# Altium footprint library TarabusLib_KAP.PcbLib: 504 footprints (part 8 of 32)
Each footprint in its own frame and in the unit in brackets; x right, y up, seen from the top. Pads: shape width x height; smd on the part's side, far side on the other; paste and mask are expansions set on the pad; w line width, h text height; cw(c..) or ccw(c..) is an arc to the next point about the centre after c.
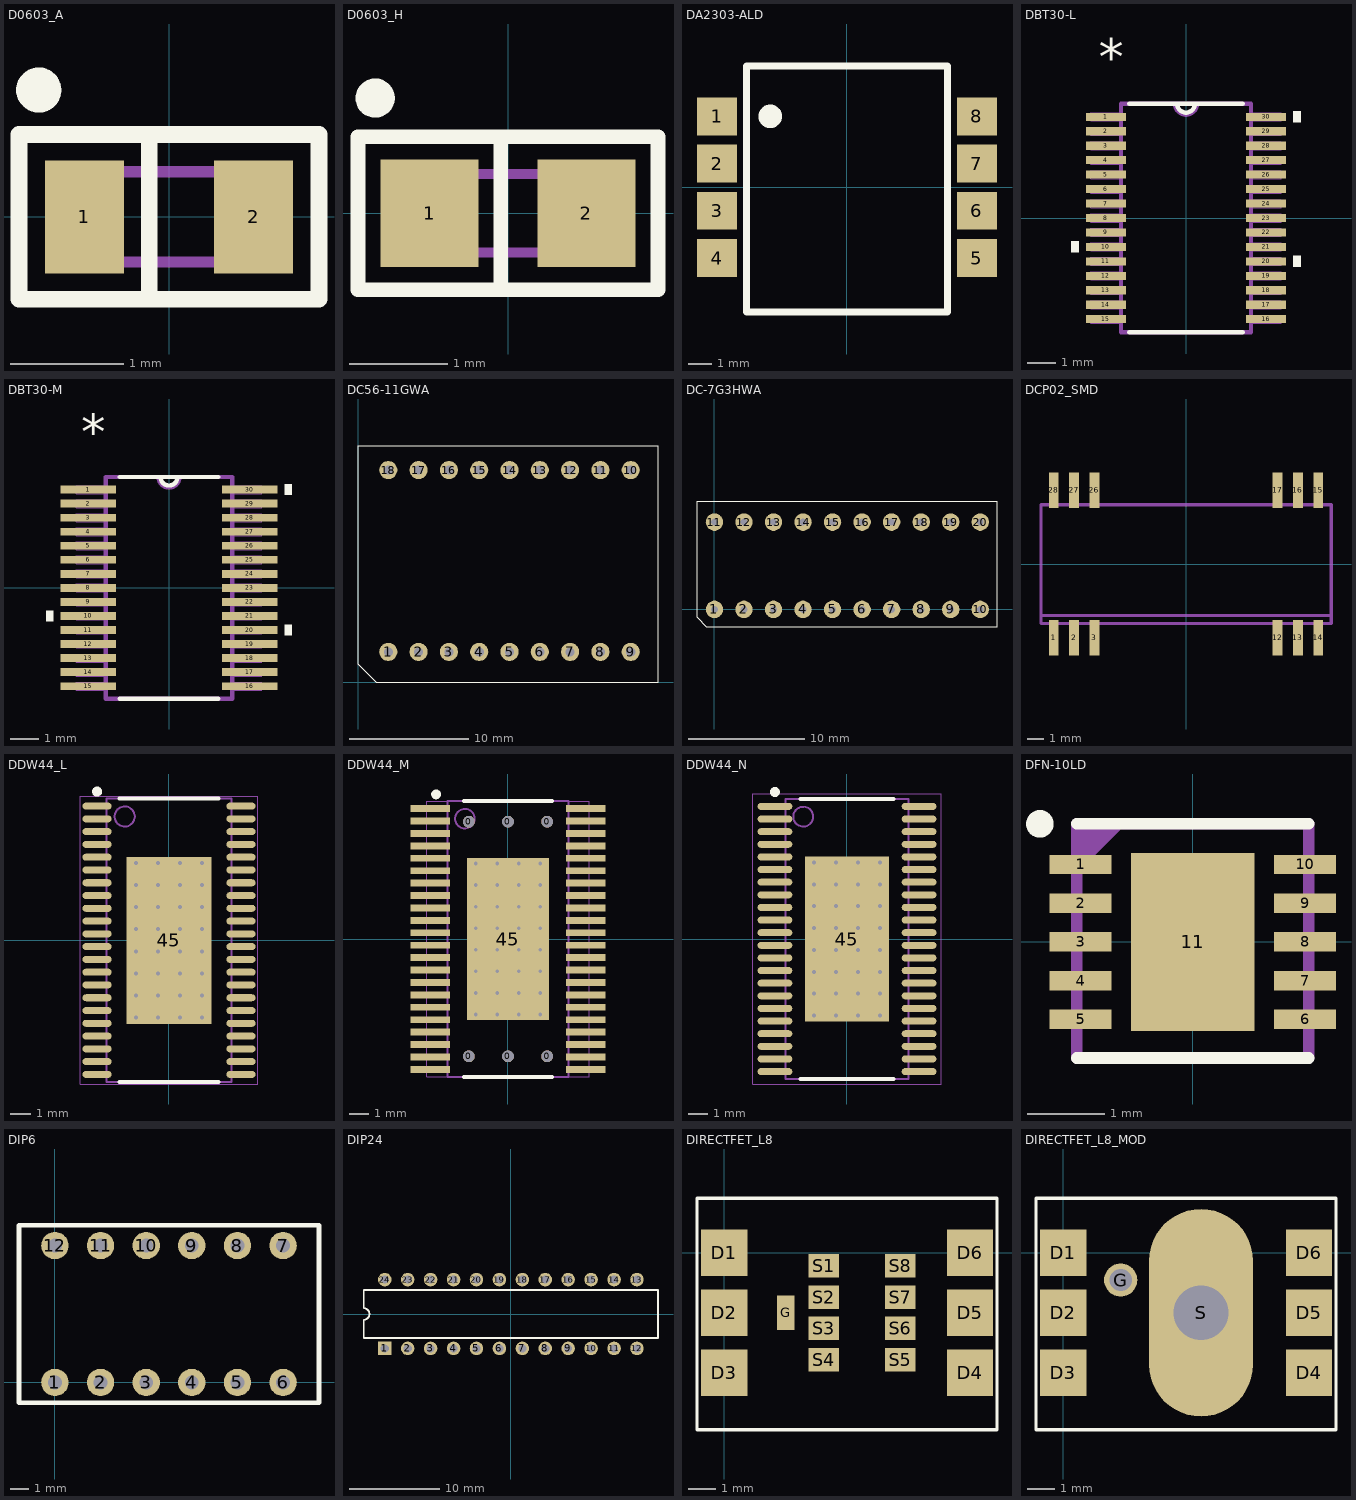
[diagram p7: the footprints below, top view; thin cyan lines are the x and y axes]

## D0603_A [mm]
height 1.1
pads (2):
  rect 0.7x1 smd: 1(-0.75,0) 2(0.75,0)
Top Overlay:
  circle w0.2: c-1.155,1.125 r0.1
  lines w0.15: -0.175,-0.73 -0.175,0.73 ; -1.33,-0.73 -1.33,0.73 1.33,0.73 1.33,-0.73 -1.33,-0.73
Mechanical 7:
  lines w0.1: -0.7,-0.4 -0.7,0.4 ; -0.6,-0.4 -0.6,0.4 ; -0.5,-0.4 -0.5,0.4 ; -0.8,-0.4 0.8,-0.4 0.8,0.4 -0.8,0.4 -0.8,-0.4
Mechanical 10:
  text ".Comment" at -0.75,-1.28 h0.6
  text ".Designator" at -0.62,1 h0.8
3D body: height 1.1, standoff 0, extent -0.8,-0.4 0.8,0.4

## D0603_H [mm]
height 1.1
pads (2):
  rect 1x1.1 smd: 1(-0.8,0) 2(0.8,0)
Top Overlay:
  circle w0.2: c-1.355,1.175 r0.1
  lines w0.15: -0.075,-0.78 -0.075,0.78 ; -1.53,-0.78 -1.53,0.78 1.53,0.78 1.53,-0.78 -1.53,-0.78
Mechanical 7:
  lines w0.1: -0.7,-0.4 -0.7,0.4 ; -0.6,-0.4 -0.6,0.4 ; -0.5,-0.4 -0.5,0.4 ; -0.8,-0.4 0.8,-0.4 0.8,0.4 -0.8,0.4 -0.8,-0.4
Mechanical 10:
  text ".Designator" at -0.62,1 h0.8
  text ".Comment" at -0.61,-1.33 h0.6
3D body: height 1.1, standoff 0, extent -0.8,-0.4 0.8,0.4

## DA2303-ALD [mm]
pads (8):
  rect 1.7x1.6 smd: 1(-5.5,3) 2(-5.5,1) 3(-5.5,-1) 4(-5.5,-3) 5(5.5,-3) 6(5.5,-1) 7(5.5,1) 8(5.5,3)
Top Overlay:
  circle w0.5: c-3.25,3 r0.25
  lines w0.3: -4.25,-5.275 -4.25,5.125 4.25,5.125 4.25,-5.125 4.25,-5.275 -4.25,-5.275
3D body "coil-da2303.STEP": height 5.95, standoff -0.02, extent -6.023,-5.075 6.047,4.925

## DBT30-L [mil]
height 47
pads (30):
  rect 54x11 smd: 1(-109,137.8) 2(-109,118.11) 3(-109,98.43) 4(-109,78.74) 5(-109,59.06) 6(-109,39.37) 7(-109,19.68) 8(-109,0) 9(-109,-19.69) 10(-109,-39.37) 11(-109,-59.06) 12(-109,-78.74) 13(-109,-98.43) 14(-109,-118.11) 15(-109,-137.8) 16(109,-137.8) 17(109,-118.11) 18(109,-98.43) 19(109,-78.74) 20(109,-59.06) 21(109,-39.37) 22(109,-19.68) 23(109,0) 24(109,19.69) 25(109,39.37) 26(109,59.06) 27(109,78.74) 28(109,98.43) 29(109,118.11) 30(109,137.8)
Top Overlay:
  region: 146,145.3 156,145.3 156,130.3 146,130.3
  region: 146,-51.56 156,-51.56 156,-66.56 146,-66.56
  region: -146,-31.87 -156,-31.87 -156,-46.87 -146,-46.87
  lines w6: -77.24,-155.5 77.24,-155.5 ; -77.24,155.5 77.24,155.5 ; -12,155.5 ccw(c0,155.5) 12,155.5
  text "*" at -119,193.8 h50
Mechanical 1:
  lines w0: -12,155.5 ccw(c0,155.5) 12,155.5 ; -130,-143.3 -88.5,-143.3 -88.5,-132.3 -130,-132.3 -130,-143.3 ; -130,-123.61 -88.5,-123.61 -88.5,-112.61 -130,-112.61 -130,-123.61 ; -130,-103.93 -88.5,-103.93 -88.5,-92.93 -130,-92.93 -130,-103.93 ; -130,-84.24 -88.5,-84.24 -88.5,-73.24 -130,-73.24 -130,-84.24 ; -130,-64.56 -88.5,-64.56 -88.5,-53.56 -130,-53.56 -130,-64.56 ; -130,-44.87 -88.5,-44.87 -88.5,-33.87 -130,-33.87 -130,-44.87 ; -130,-25.19 -88.5,-25.19 -88.5,-14.19 -130,-14.19 -130,-25.19 ; -130,-5.5 -88.5,-5.5 -88.5,5.5 -130,5.5 -130,-5.5 ; -130,14.19 -88.5,14.19 -88.5,25.18 -130,25.18 -130,14.19 ; -130,33.87 -88.5,33.87 -88.5,44.87 -130,44.87 -130,33.87 ; -130,53.56 -88.5,53.56 -88.5,64.56 -130,64.56 -130,53.56 ; -130,73.24 -88.5,73.24 -88.5,84.24 -130,84.24 -130,73.24 ; -130,92.93 -88.5,92.93 -88.5,103.93 -130,103.93 -130,92.93 ; -130,112.61 -88.5,112.61 -88.5,123.61 -130,123.61 -130,112.61 ; -130,132.3 -88.5,132.3 -88.5,143.3 -130,143.3 -130,132.3 ; -88.5,-155.5 -88.5,155.5 88.5,155.5 88.5,-155.5 -88.5,-155.5 ; 88.5,-143.3 130,-143.3 130,-132.3 88.5,-132.3 88.5,-143.3 ; 88.5,-123.61 130,-123.61 130,-112.61 88.5,-112.61 88.5,-123.61 ; 88.5,-103.93 130,-103.93 130,-92.93 88.5,-92.93 88.5,-103.93 ; 88.5,-84.24 130,-84.24 130,-73.24 88.5,-73.24 88.5,-84.24 ; 88.5,-64.56 130,-64.56 130,-53.56 88.5,-53.56 88.5,-64.56 ; 88.5,-44.87 130,-44.87 130,-33.87 88.5,-33.87 88.5,-44.87 ; 88.5,-25.18 130,-25.18 130,-14.19 88.5,-14.19 88.5,-25.18 ; 88.5,-5.5 130,-5.5 130,5.5 88.5,5.5 88.5,-5.5 ; 88.5,14.19 130,14.19 130,25.19 88.5,25.19 88.5,14.19 ; 88.5,33.87 130,33.87 130,44.87 88.5,44.87 88.5,33.87 ; 88.5,53.56 130,53.56 130,64.56 88.5,64.56 88.5,53.56 ; 88.5,73.24 130,73.24 130,84.24 88.5,84.24 88.5,73.24 ; 88.5,92.93 130,92.93 130,103.93 88.5,103.93 88.5,92.93 ; 88.5,112.61 130,112.61 130,123.61 88.5,123.61 88.5,112.61 ; 88.5,132.3 130,132.3 130,143.3 88.5,143.3 88.5,132.3
  lines w6: -14.75,155.5 ccw(c0,155.5) 14.75,155.5 ; -88.5,-155.5 88.5,-155.5 88.5,155.5 -88.5,155.5 -88.5,-155.5
  text "47" at 0,0 h50
  text "*" at -119,193.8 h50

## DBT30-M [mil]
height 47
pads (30):
  rect 78x11 smd: 1(-113,137.8) 2(-113,118.11) 3(-113,98.43) 4(-113,78.74) 5(-113,59.06) 6(-113,39.37) 7(-113,19.68) 8(-113,0) 9(-113,-19.69) 10(-113,-39.37) 11(-113,-59.06) 12(-113,-78.74) 13(-113,-98.43) 14(-113,-118.11) 15(-113,-137.8) 16(113,-137.8) 17(113,-118.11) 18(113,-98.43) 19(113,-78.74) 20(113,-59.06) 21(113,-39.37) 22(113,-19.68) 23(113,0) 24(113,19.69) 25(113,39.37) 26(113,59.06) 27(113,78.74) 28(113,98.43) 29(113,118.11) 30(113,137.8)
Top Overlay:
  region: -162,-31.87 -172,-31.87 -172,-46.87 -162,-46.87
  region: 162,-51.56 172,-51.56 172,-66.56 162,-66.56
  region: 162,145.3 172,145.3 172,130.3 162,130.3
  lines w6: -69.24,-155.5 69.24,-155.5 ; -69.24,155.5 69.24,155.5 ; -12,155.5 ccw(c0,155.5) 12,155.5
  text "*" at -123,193.8 h50
Mechanical 1:
  lines w0: -12,155.5 ccw(c0,155.5) 12,155.5 ; -130,-143.3 -130,-132.3 -88.5,-132.3 -88.5,-143.3 -130,-143.3 ; -130,-123.61 -130,-112.61 -88.5,-112.61 -88.5,-123.61 -130,-123.61 ; -130,-103.93 -130,-92.93 -88.5,-92.93 -88.5,-103.93 -130,-103.93 ; -130,-84.24 -130,-73.24 -88.5,-73.24 -88.5,-84.24 -130,-84.24 ; -130,-64.56 -130,-53.56 -88.5,-53.56 -88.5,-64.56 -130,-64.56 ; -130,-44.87 -130,-33.87 -88.5,-33.87 -88.5,-44.87 -130,-44.87 ; -130,-25.19 -130,-14.19 -88.5,-14.19 -88.5,-25.19 -130,-25.19 ; -130,-5.5 -130,5.5 -88.5,5.5 -88.5,-5.5 -130,-5.5 ; -130,14.19 -130,25.18 -88.5,25.18 -88.5,14.19 -130,14.19 ; -130,33.87 -130,44.87 -88.5,44.87 -88.5,33.87 -130,33.87 ; -130,53.56 -130,64.56 -88.5,64.56 -88.5,53.56 -130,53.56 ; -130,73.24 -130,84.24 -88.5,84.24 -88.5,73.24 -130,73.24 ; -130,92.93 -130,103.93 -88.5,103.93 -88.5,92.93 -130,92.93 ; -130,112.61 -130,123.61 -88.5,123.61 -88.5,112.61 -130,112.61 ; -130,132.3 -130,143.3 -88.5,143.3 -88.5,132.3 -130,132.3 ; -88.5,-155.5 88.5,-155.5 88.5,155.5 -88.5,155.5 -88.5,-155.5 ; 88.5,-143.3 88.5,-132.3 130,-132.3 130,-143.3 88.5,-143.3 ; 88.5,-123.61 88.5,-112.61 130,-112.61 130,-123.61 88.5,-123.61 ; 88.5,-103.93 88.5,-92.93 130,-92.93 130,-103.93 88.5,-103.93 ; 88.5,-84.24 88.5,-73.24 130,-73.24 130,-84.24 88.5,-84.24 ; 88.5,-64.56 88.5,-53.56 130,-53.56 130,-64.56 88.5,-64.56 ; 88.5,-44.87 88.5,-33.87 130,-33.87 130,-44.87 88.5,-44.87 ; 88.5,-25.18 88.5,-14.19 130,-14.19 130,-25.18 88.5,-25.18 ; 88.5,-5.5 88.5,5.5 130,5.5 130,-5.5 88.5,-5.5 ; 88.5,14.19 88.5,25.19 130,25.19 130,14.19 88.5,14.19 ; 88.5,33.87 88.5,44.87 130,44.87 130,33.87 88.5,33.87 ; 88.5,53.56 88.5,64.56 130,64.56 130,53.56 88.5,53.56 ; 88.5,73.24 88.5,84.24 130,84.24 130,73.24 88.5,73.24 ; 88.5,92.93 88.5,103.93 130,103.93 130,92.93 88.5,92.93 ; 88.5,112.61 88.5,123.61 130,123.61 130,112.61 88.5,112.61 ; 88.5,132.3 88.5,143.3 130,143.3 130,132.3 88.5,132.3
  lines w6: -14.75,155.5 ccw(c0,155.5) 14.75,155.5 ; -88.5,-155.5 -88.5,155.5 88.5,155.5 88.5,-155.5 -88.5,-155.5
  text "*" at -123,193.8 h50
  text "47" at 0,0 h50

## DC56-11GWA [mil] "Индикатор 7 сегментный 2 разрядный ОК"
pads (18):
  round 60 hole 30: 1(100,100) 2(200,100) 3(300,100) 4(400,100) 5(500,100) 6(600,100) 7(700,100) 8(800,100) 9(900,100) 10(900,700) 11(800,700) 12(700,700) 13(600,700) 14(500,700) 15(400,700) 16(300,700) 17(200,700) 18(100,700)
Top Overlay:
  lines w3.94: 0,60 0,780 990,780 990,0 60,0 0,60

## DC-7G3HWA [mm] "Линейка светодиодов 7 зеленых + 3 красных"
height 12
pads (20):
  round 1.5 hole 0.6: 1(0,0) 2(2.54,0) 3(5.08,0) 4(7.62,0) 5(10.16,0) 6(12.7,0) 7(15.24,0) 8(17.78,0) 9(20.32,0) 10(22.86,0) 11(0,7.5) 12(2.54,7.5) 13(5.08,7.5) 14(7.62,7.5) 15(10.16,7.5) 16(12.7,7.5) 17(15.24,7.5) 18(17.78,7.5) 19(20.32,7.5) 20(22.86,7.5)
Top Overlay:
  lines w0.1: -1.5,-0.7 -0.7,-1.5 24.3,-1.5 24.3,9.3 -1.5,9.3 -1.5,7.5 -1.5,-0.7
3D body "DC-7G3HWA.STEP": height 8, standoff -4, extent -1.3,-1.26 24.1,8.9

## DCP02_SMD [mil]
pads (12):
  rect 24x87 smd: 1(-325,-181.1) 2(-275,-181.1) 3(-225,-181.1) 12(225,-181.1) 13(275,-181.1) 14(325,-181.1) 15(325,182) 16(275,182) 17(225,182) 26(-225,182) 27(-275,182) 28(-325,182)
Mechanical 16:
  rectangle: -334.65,-209.45 -315.35,-149.61
  rectangle: -284.65,-209.45 -265.35,-149.61
  rectangle: -234.65,-209.45 -215.35,-149.61
  rectangle: 216,-209.45 235,-149.61
  rectangle: 266,-209.45 285,-149.61
  rectangle: 316,-209.45 335,-149.61
  rectangle: 316,150 335,210
  rectangle: 266,150 285,210
  rectangle: 216,150 235,210
  rectangle: -234.65,150 -215.35,210
  rectangle: -284.65,150 -265.35,210
  rectangle: -334.65,150 -315.35,210
  lines w8: -356.3,-125.98 -356.3,-145.67 357,-145.67 357,-125.98 ; -356.3,-125.98 -356.3,146 357,146 357,-125.98 ; -356.3,-125.98 357,-125.98

## DDW44_L [mm] "TSOP, 44-Leads, Body 14x6.1mm, Pitch 0.635mm, Thermal Pad 8.3x4.2mm, IPC High Density"
height 1.2
pads (45):
  oval 1.45x0.35 smd: 1(-3.575,6.667) 2(-3.575,6.032) 3(-3.575,5.397) 4(-3.575,4.763) 5(-3.575,4.127) 6(-3.575,3.492) 7(-3.575,2.857) 8(-3.575,2.222) 9(-3.575,1.587) 10(-3.575,0.953) 11(-3.575,0.318) 12(-3.575,-0.318) 13(-3.575,-0.953) 14(-3.575,-1.587) 15(-3.575,-2.222) 16(-3.575,-2.857) 17(-3.575,-3.492) 18(-3.575,-4.127) 19(-3.575,-4.763) 20(-3.575,-5.397) 21(-3.575,-6.032) 22(-3.575,-6.667) 23(3.575,-6.667) 24(3.575,-6.032) 25(3.575,-5.397) 26(3.575,-4.763) 27(3.575,-4.127) 28(3.575,-3.492) 29(3.575,-2.857) 30(3.575,-2.222) 31(3.575,-1.587) 32(3.575,-0.953) 33(3.575,-0.318) 34(3.575,0.318) 35(3.575,0.953) 36(3.575,1.587) 37(3.575,2.222) 38(3.575,2.857) 39(3.575,3.492) 40(3.575,4.127) 41(3.575,4.763) 42(3.575,5.397) 43(3.575,6.032) 44(3.575,6.667)
  rect 4.2x8.3 smd: 45(0,0)
via -1.65,3.85 diameter 0.5 hole 0.2
via -0.55,3.85 diameter 0.5 hole 0.2
via 0.55,3.85 diameter 0.5 hole 0.2
via 1.65,3.85 diameter 0.5 hole 0.2
via 1.65,2.75 diameter 0.5 hole 0.2
via 1.65,1.65 diameter 0.5 hole 0.2
via 1.65,0.55 diameter 0.5 hole 0.2
via 1.65,-0.55 diameter 0.5 hole 0.2
via 1.65,-1.65 diameter 0.5 hole 0.2
via 1.65,-2.75 diameter 0.5 hole 0.2
via 1.65,-3.85 diameter 0.5 hole 0.2
via 0.55,-3.85 diameter 0.5 hole 0.2
via -0.55,-3.85 diameter 0.5 hole 0.2
via -1.65,-3.85 diameter 0.5 hole 0.2
via -1.65,-2.75 diameter 0.5 hole 0.2
via -1.65,-1.65 diameter 0.5 hole 0.2
via -1.65,-0.55 diameter 0.5 hole 0.2
via -1.65,0.55 diameter 0.5 hole 0.2
via -1.65,1.65 diameter 0.5 hole 0.2
via -1.65,2.75 diameter 0.5 hole 0.2
via -0.55,2.75 diameter 0.5 hole 0.2
via 0.55,2.75 diameter 0.5 hole 0.2
via 0.55,1.65 diameter 0.5 hole 0.2
via 0.55,0.55 diameter 0.5 hole 0.2
via 0.55,-0.55 diameter 0.5 hole 0.2
via 0.55,-1.65 diameter 0.5 hole 0.2
via 0.55,-2.75 diameter 0.5 hole 0.2
via -0.55,-2.75 diameter 0.5 hole 0.2
via -0.55,-1.65 diameter 0.5 hole 0.2
via -0.55,-0.55 diameter 0.5 hole 0.2
via -0.55,0.55 diameter 0.5 hole 0.2
via -0.55,1.65 diameter 0.5 hole 0.2
Top Overlay:
  circle w0.25: c-3.575,7.392 r0.125
  lines w0.2: -2.45,-7.05 2.45,-7.05 ; -2.45,7.05 2.45,7.05
Mechanical 13:
  circle w0.1: c-2.2,6.15 r0.5
  lines w0.1: -3.1,-7.05 3.1,-7.05 3.1,7.05 -3.1,7.05 -3.1,-7.05
Mechanical 15:
  lines w0.05: -4.4,-7.15 4.4,-7.15 4.4,7.15 -4.4,7.15 -4.4,-7.15
  lines w0.1: -0.5,0 0.5,0 ; 0,-0.5 0,0.5
3D body: height 1.2, standoff 0.05, extent -3.1,-7.05 3.1,7.05

## DDW44_M [mm] "TSOP, 44-Leads, Body 14x6.1mm, Pitch 0.635mm, Thermal Pad 8.3x4.2mm, IPC Low Density"
height 1.2
pads (51):
  round 0.6 hole 0.6: 0(-2,-6) 0(-2,6) 0(0,-6) 0(0,6) 0(2,-6) 0(2,6)
  rect 2x0.35 smd: 1(-3.975,6.667) 2(-3.975,6.032) 3(-3.975,5.397) 4(-3.975,4.763) 5(-3.975,4.127) 6(-3.975,3.492) 7(-3.975,2.857) 8(-3.975,2.222) 9(-3.975,1.587) 10(-3.975,0.953) 11(-3.975,0.318) 12(-3.975,-0.318) 13(-3.975,-0.953) 14(-3.975,-1.587) 15(-3.975,-2.222) 16(-3.975,-2.857) 17(-3.975,-3.492) 18(-3.975,-4.127) 19(-3.975,-4.763) 20(-3.975,-5.397) 21(-3.975,-6.032) 22(-3.975,-6.667) 23(3.975,-6.667) 24(3.975,-6.032) 25(3.975,-5.397) 26(3.975,-4.763) 27(3.975,-4.127) 28(3.975,-3.492) 29(3.975,-2.857) 30(3.975,-2.222) 31(3.975,-1.587) 32(3.975,-0.953) 33(3.975,-0.318) 34(3.975,0.318) 35(3.975,0.953) 36(3.975,1.587) 37(3.975,2.222) 38(3.975,2.857) 39(3.975,3.492) 40(3.975,4.127) 41(3.975,4.763) 42(3.975,5.397) 43(3.975,6.032) 44(3.975,6.667)
  rect 4.2x8.3 smd: 45(0,0)
via -0.55,1.65 diameter 0.5 hole 0.2
via -0.55,0.55 diameter 0.5 hole 0.2
via -0.55,-0.55 diameter 0.5 hole 0.2
via -0.55,-1.65 diameter 0.5 hole 0.2
via -0.55,-2.75 diameter 0.5 hole 0.2
via 0.55,-2.75 diameter 0.5 hole 0.2
via 0.55,-1.65 diameter 0.5 hole 0.2
via 0.55,-0.55 diameter 0.5 hole 0.2
via 0.55,0.55 diameter 0.5 hole 0.2
via 0.55,1.65 diameter 0.5 hole 0.2
via 0.55,2.75 diameter 0.5 hole 0.2
via -0.55,2.75 diameter 0.5 hole 0.2
via -1.65,2.75 diameter 0.5 hole 0.2
via -1.65,1.65 diameter 0.5 hole 0.2
via -1.65,0.55 diameter 0.5 hole 0.2
via -1.65,-0.55 diameter 0.5 hole 0.2
via -1.65,-1.65 diameter 0.5 hole 0.2
via -1.65,-2.75 diameter 0.5 hole 0.2
via -1.65,-3.85 diameter 0.5 hole 0.2
via -0.55,-3.85 diameter 0.5 hole 0.2
via 0.55,-3.85 diameter 0.5 hole 0.2
via 1.65,-3.85 diameter 0.5 hole 0.2
via 1.65,-2.75 diameter 0.5 hole 0.2
via 1.65,-1.65 diameter 0.5 hole 0.2
via 1.65,-0.55 diameter 0.5 hole 0.2
via 1.65,0.55 diameter 0.5 hole 0.2
via 1.65,1.65 diameter 0.5 hole 0.2
via 1.65,2.75 diameter 0.5 hole 0.2
via 1.65,3.85 diameter 0.5 hole 0.2
via 0.55,3.85 diameter 0.5 hole 0.2
via -0.55,3.85 diameter 0.5 hole 0.2
via -1.65,3.85 diameter 0.5 hole 0.2
Top Overlay:
  circle w0.25: c-3.675,7.392 r0.125
  lines w0.2: -2.25,-7.05 2.25,-7.05 ; -2.25,7.05 2.25,7.05
Mechanical 7:
  lines w0.05: -4.15,-7.05 4.15,-7.05 4.15,7.05 -4.15,7.05 -4.15,-7.05
  lines w0.1: -0.5,0 0.5,0 ; 0,-0.5 0,0.5
Mechanical 9:
  circle w0.1: c-2.2,6.15 r0.5
  lines w0.1: -3.1,-7.05 -3.1,7.05 3.1,7.05 3.1,-7.05 -3.1,-7.05
3D body: height 1.2, standoff 0.05, extent -3.1,-7.05 3.1,7.05
3D body: height 0.7, standoff 0, extent -4.15,6.5 -3.1,6.825
3D body: height 0.7, standoff 0, extent -4.15,5.875 -3.1,6.2
3D body: height 0.7, standoff 0, extent -4.15,5.225 -3.1,5.55
3D body: height 0.7, standoff 0, extent -4.15,4.613 -3.1,4.938
3D body: height 0.7, standoff 0, extent -4.15,3.95 -3.1,4.275
3D body: height 0.7, standoff 0, extent -4.15,0.775 -3.1,1.1
3D body: height 0.7, standoff 0, extent -4.15,1.438 -3.1,1.763
3D body: height 0.7, standoff 0, extent -4.15,2.05 -3.1,2.375
3D body: height 0.7, standoff 0, extent -4.15,2.7 -3.1,3.025
3D body: height 0.7, standoff 0, extent -4.15,3.325 -3.1,3.65
3D body: height 0.7, standoff 0, extent -4.125,-2.4 -3.075,-2.075
3D body: height 0.7, standoff 0, extent -4.125,-1.737 -3.075,-1.412
3D body: height 0.7, standoff 0, extent -4.125,-1.125 -3.075,-0.8
3D body: height 0.7, standoff 0, extent -4.125,-0.475 -3.075,-0.15
3D body: height 0.7, standoff 0, extent -4.125,0.15 -3.075,0.475
3D body: height 0.7, standoff 0, extent -4.15,-5.562 -3.1,-5.237
3D body: height 0.7, standoff 0, extent -4.15,-4.937 -3.1,-4.612
3D body: height 0.7, standoff 0, extent -4.15,-4.3 -3.1,-3.975
3D body: height 0.7, standoff 0, extent -4.15,-3.662 -3.1,-3.337
3D body: height 0.7, standoff 0, extent -4.15,-3.012 -3.1,-2.687
3D body: height 0.7, standoff 0, extent -4.15,-6.8 -3.1,-6.475
3D body: height 0.7, standoff 0, extent -4.15,-6.187 -3.1,-5.862
3D body: height 0.7, standoff 0, extent 3.1,-6.212 4.15,-5.887
3D body: height 0.7, standoff 0, extent 3.1,-6.825 4.15,-6.5
3D body: height 0.7, standoff 0, extent 3.1,-3.037 4.15,-2.712
3D body: height 0.7, standoff 0, extent 3.1,-3.687 4.15,-3.362
3D body: height 0.7, standoff 0, extent 3.1,-4.325 4.15,-4
3D body: height 0.7, standoff 0, extent 3.1,-4.962 4.15,-4.637
3D body: height 0.7, standoff 0, extent 3.1,-5.587 4.15,-5.262
3D body: height 0.7, standoff 0, extent 3.125,0.125 4.175,0.45
3D body: height 0.7, standoff 0, extent 3.125,-0.5 4.175,-0.175
3D body: height 0.7, standoff 0, extent 3.125,-1.15 4.175,-0.825
3D body: height 0.7, standoff 0, extent 3.125,-1.762 4.175,-1.437
3D body: height 0.7, standoff 0, extent 3.125,-2.425 4.175,-2.1
3D body: height 0.7, standoff 0, extent 3.1,3.3 4.15,3.625
3D body: height 0.7, standoff 0, extent 3.1,2.675 4.15,3
3D body: height 0.7, standoff 0, extent 3.1,2.025 4.15,2.35
3D body: height 0.7, standoff 0, extent 3.1,1.413 4.15,1.738
3D body: height 0.7, standoff 0, extent 3.1,0.75 4.15,1.075
3D body: height 0.7, standoff 0, extent 3.1,3.925 4.15,4.25
3D body: height 0.7, standoff 0, extent 3.1,4.588 4.15,4.913
3D body: height 0.7, standoff 0, extent 3.1,5.2 4.15,5.525
3D body: height 0.7, standoff 0, extent 3.1,5.85 4.15,6.175
3D body: height 0.7, standoff 0, extent 3.1,6.475 4.15,6.8

## DDW44_N [mm] "TSOP, 44-Leads, Body 14x6.1mm, Pitch 0.635mm, Thermal Pad 8.3x4.2mm, IPC Medium Density"
height 1.2
pads (45):
  oval 1.75x0.35 smd: 1(-3.625,6.667) 2(-3.625,6.032) 3(-3.625,5.397) 4(-3.625,4.763) 5(-3.625,4.127) 6(-3.625,3.492) 7(-3.625,2.857) 8(-3.625,2.222) 9(-3.625,1.587) 10(-3.625,0.953) 11(-3.625,0.318) 12(-3.625,-0.318) 13(-3.625,-0.953) 14(-3.625,-1.587) 15(-3.625,-2.222) 16(-3.625,-2.857) 17(-3.625,-3.492) 18(-3.625,-4.127) 19(-3.625,-4.763) 20(-3.625,-5.397) 21(-3.625,-6.032) 22(-3.625,-6.667) 23(3.625,-6.667) 24(3.625,-6.032) 25(3.625,-5.397) 26(3.625,-4.763) 27(3.625,-4.127) 28(3.625,-3.492) 29(3.625,-2.857) 30(3.625,-2.222) 31(3.625,-1.587) 32(3.625,-0.953) 33(3.625,-0.318) 34(3.625,0.318) 35(3.625,0.953) 36(3.625,1.587) 37(3.625,2.222) 38(3.625,2.857) 39(3.625,3.492) 40(3.625,4.127) 41(3.625,4.763) 42(3.625,5.397) 43(3.625,6.032) 44(3.625,6.667)
  rect 4.2x8.3 smd: 45(0,0)
via -0.55,1.65 diameter 0.5 hole 0.2
via -0.55,0.55 diameter 0.5 hole 0.2
via -0.55,-0.55 diameter 0.5 hole 0.2
via -0.55,-1.65 diameter 0.5 hole 0.2
via -0.55,-2.75 diameter 0.5 hole 0.2
via 0.55,-2.75 diameter 0.5 hole 0.2
via 0.55,-1.65 diameter 0.5 hole 0.2
via 0.55,-0.55 diameter 0.5 hole 0.2
via 0.55,0.55 diameter 0.5 hole 0.2
via 0.55,1.65 diameter 0.5 hole 0.2
via 0.55,2.75 diameter 0.5 hole 0.2
via -0.55,2.75 diameter 0.5 hole 0.2
via -1.65,2.75 diameter 0.5 hole 0.2
via -1.65,1.65 diameter 0.5 hole 0.2
via -1.65,0.55 diameter 0.5 hole 0.2
via -1.65,-0.55 diameter 0.5 hole 0.2
via -1.65,-1.65 diameter 0.5 hole 0.2
via -1.65,-2.75 diameter 0.5 hole 0.2
via -1.65,-3.85 diameter 0.5 hole 0.2
via -0.55,-3.85 diameter 0.5 hole 0.2
via 0.55,-3.85 diameter 0.5 hole 0.2
via 1.65,-3.85 diameter 0.5 hole 0.2
via 1.65,-2.75 diameter 0.5 hole 0.2
via 1.65,-1.65 diameter 0.5 hole 0.2
via 1.65,-0.55 diameter 0.5 hole 0.2
via 1.65,0.55 diameter 0.5 hole 0.2
via 1.65,1.65 diameter 0.5 hole 0.2
via 1.65,2.75 diameter 0.5 hole 0.2
via 1.65,3.85 diameter 0.5 hole 0.2
via 0.55,3.85 diameter 0.5 hole 0.2
via -0.55,3.85 diameter 0.5 hole 0.2
via -1.65,3.85 diameter 0.5 hole 0.2
Top Overlay:
  circle w0.25: c-3.625,7.392 r0.125
  lines w0.2: -2.35,-7.05 2.35,-7.05 ; -2.35,7.05 2.35,7.05
Mechanical 13:
  circle w0.1: c-2.2,6.15 r0.5
  lines w0.1: -3.1,-7.05 -3.1,7.05 3.1,7.05 3.1,-7.05 -3.1,-7.05
Mechanical 15:
  lines w0.05: -4.75,-7.3 -4.75,7.3 4.75,7.3 4.75,-7.3 -4.75,-7.3
  lines w0.1: -0.5,0 0.5,0 ; 0,-0.5 0,0.5
3D body: height 1.2, standoff 0.05, extent -3.1,-7.05 3.1,7.05

## DFN-10LD [mm] "10 LEAD DUAL FLAT PACKAGE"
height 0.9
pads (11):
  rect 0.8x0.25 smd mask+0: 1(-1.45,1) 2(-1.45,0.5) 3(-1.45,0) 4(-1.45,-0.5) 5(-1.45,-1) 6(1.45,-1) 7(1.45,-0.5) 8(1.45,0) 9(1.45,0.5) 10(1.45,1)
  rect 1.6x2.3 smd mask+0: 11(0,0)
Top Overlay:
  circle w0.254: c-1.975,1.525 r0.05
  lines w0.15: -1.5,-1.5 1.5,-1.5 ; -1.5,1.525 1.5,1.525
Mechanical 7:
  lines w0.15: -1.5,1.5 -1.5,-1.5 1.5,-1.5 1.5,1.5 ; -1.5,1.525 1.5,1.525 ; -1.486,1.302 -1.269,1.519 ; -1.483,1.002 -0.968,1.518 ; -1.473,1.177 -1.138,1.512
Mechanical 10:
  text ".Comment" at -0.525,2.025 h0.7
  text ".Designator" at -0.85,-2.075 h0.7
3D body: height 0.8, standoff 0, extent -1.505,-1.5 1.5,1.525

## DIP6 [mil]
pads (12):
  round 60 hole 30: 1(0,0) 2(100,0) 3(200,0) 4(300,0) 5(400,0) 6(500,0) 7(500,300) 8(400,300) 9(300,300) 10(200,300) 11(100,300) 12(0,300)
Top Overlay:
  lines w10: -78.74,-44.88 578.74,-44.88 578.74,344.88 -78.74,344.88 -78.74,-44.88
3D body "DIP 6 позиций.STEP": height 354.33, standoff -143.7, extent -76.74,-104.82 580.74,344

## DIP24 [mm] "DIP; 24 Leads; Row Spacing 7.62 mm; Pitch 2.54 mm"
height 5.33
pads (24):
  rect 1.5x1.5 hole 0.9: 1(-13.97,-3.81)
  round 1.5 hole 0.9: 2(-11.43,-3.81) 3(-8.89,-3.81) 4(-6.35,-3.81) 5(-3.81,-3.81) 6(-1.27,-3.81) 7(1.27,-3.81) 8(3.81,-3.81) 9(6.35,-3.81) 10(8.89,-3.81) 11(11.43,-3.81) 12(13.97,-3.81) 13(13.97,3.81) 14(11.43,3.81) 15(8.89,3.81) 16(6.35,3.81) 17(3.81,3.81) 18(1.27,3.81) 19(-1.27,3.81) 20(-3.81,3.81) 21(-6.35,3.81) 22(-8.89,3.81) 23(-11.43,3.81) 24(-13.97,3.81)
Top Overlay:
  lines w0.2: -16.3,-2.65 16.3,-2.65 16.3,2.65 -16.3,2.65 -16.3,0.635 cw(c-16.3,0) -16.3,-0.635 -16.3,-2.65

## DIRECTFET_L8 [mil]
pads (15):
  rect 67x67 smd: D1(0,0) D2(0,-86.61) D3(0,-173.23) D4(355,-173.23) D5(355,-86.61) D6(355,0)
  rect 25x50 smd: G(89,-86.61)
  rect 44x34 smd: S1(144,-18.7) S2(144,-63.98) S3(144,-109.25) S4(144,-154.53) S5(254,-154.53) S6(254,-109.25) S7(254,-63.98) S8(254,-18.7)
Top Overlay:
  lines w5: -39.37,-255.91 -39.37,79 394,79 394,-255.91 -39.37,-255.91

## DIRECTFET_L8_MOD [mil]
pads (8):
  rect 67x67 smd: D1(0,0) D2(0,-86.61) D3(0,-173.23) D4(355,-173.23) D5(355,-86.61) D6(355,0)
  round 48 hole 32: G(83,-39.37)
  oval 150x300 hole 79: S(199,-86.61)
Top Overlay:
  lines w5: -39.37,-255.91 394,-255.91 394,79 -39.37,79 -39.37,-255.91